# Altium footprint library User.PcbLib: 317 footprints (part 11 of 20)
Each footprint in its own frame and in the unit in brackets; x right, y up, seen from the top. Pads: shape width x height; smd on the part's side, far side on the other; paste and mask are expansions set on the pad; w line width, h text height; cw(c..) or ccw(c..) is an arc to the next point about the centre after c.
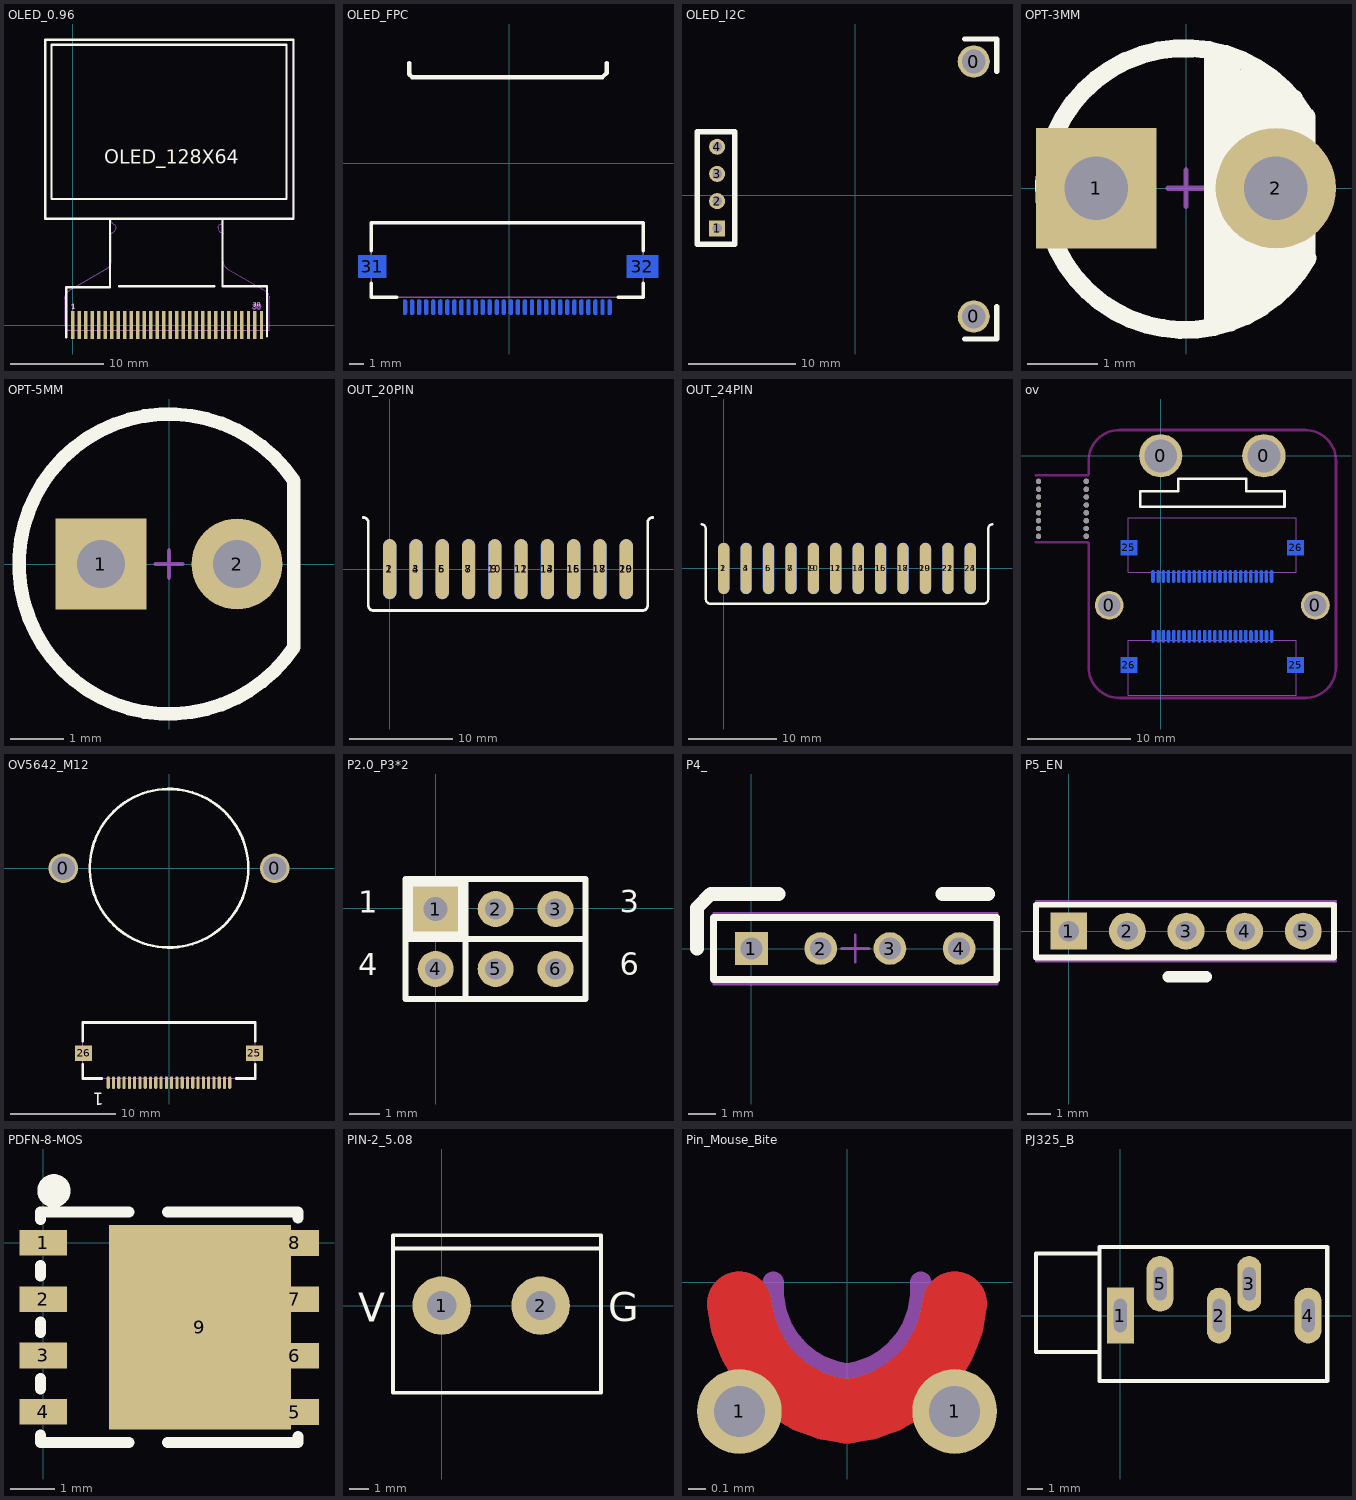
[diagram p10: the footprints below, top view; thin cyan lines are the x and y axes]

## OLED_0.96 [mil]
pads (30):
  rect 13.8x118.1 smd mask+2: 1(0,0) 2(27.6,-0.1) 3(55.1,-0.1) 4(82.7,-0.1) 5(110.2,-0.1) 6(137.8,-0.1) 7(165.3,-0.1) 8(192.9,-0.1) 9(220.5,-0.1) 10(248,-0.1) 11(275.6,-0.1) 12(303.1,-0.1) 13(330.7,-0.1) 14(358.3,-0.1) 15(385.8,-0.1) 16(413.4,-0.1) 17(440.9,-0.1) 18(468.5,-0.1) 19(496.1,-0.1) 20(523.6,-0.1) 21(551.2,-0.1) 22(578.7,-0.1) 23(606.3,-0.1) 24(633.9,-0.1) 25(661.4,-0.1) 26(689,-0.1) 27(716.5,-0.1) 28(744.1,-0.1) 29(771.6,-0.2) 30(799.2,-0.2)
Top Overlay:
  lines w10: -27.5,-51.3 -27.5,161.3 ; -27.2,159.7 157.8,159.7 157.8,451.1 ; 197.2,163.7 598.8,163.7 ; 634.2,447.1 634.2,163.7 823.2,163.7 ; 822.9,-47.4 822.9,165.2 ; -116.1,450.3 935.1,450.3 935.1,1208.6 -116.1,1208.6 -116.1,450.3 ; -90.2,533.8 905.8,533.8 905.8,1187.3 -90.2,1187.3 -90.2,533.8
  text "OLED_128X64" at 133.9,663.69 h100
  text "30" at 763,77.1 h20
  text "1" at -3.9,66.8 h20
Mechanical 6:
  region: 761.8,86.5 763.4,84.5 768.9,84.5 766.5,80.6 766.5,78.6 768.1,77.1 771.3,76.7 772,76.7 772.8,75.1 772.8,73.9 772,72.3 770.9,71.6 769.7,70.8 767.7,71.2 766.1,71.6 765.3,73.9 763.4,74.7 760.6,73.9 759.8,72.3 761,68.8 763.8,66.4 766.9,65.3 770.9,65.3 774.8,66.4 777.6,69.2 778.3,72.3 778.7,76.3 777.6,79.8 775.6,81.4 774.8,82.2 777.2,85.3 777.9,87.3 777.2,89.3 775.6,90.5 763.8,90.5 761.8,88.5
  region: 794.1,67.6 790.2,65.3 786.2,65.3 782.7,66.8 779.9,70 779.1,74.7 779.1,80.6 779.9,84.5 782.7,88.9 787.8,90.5 787.4,84.2 786.2,83.4 785.4,82.2 784.6,79 784.6,76.7 785.4,73.1 786.6,71.6 788.2,71.2 789.8,71.6 790.5,72.7 791.3,76.7 791.3,78.6 790.5,82.2 789.8,83.8 787.8,84.5 788.2,90.5 791.3,89.7 793.7,88.5 796.1,85.3 797.6,79.8 797.2,75.1 796.4,70.8 794.1,67.6
  region: -6.7,83.8 -5.1,81.8 -3.2,81.8 -1.6,82.2 -2,68.8 1.2,66 3.9,68.8 3.9,89.3 2,91.2 -0.8,90.8 -3.5,88.1 -6.3,86.5
Mechanical 15:
  drawing of 157 lines, arcs and shapes, not listed
3D body "oled-096.STEP": height 118.9, standoff 62.99, extent -116.1,-22.5 935.08,1208.6

## OLED_FPC [mm]
pads (32):
  oval 0.28x1.1 smd far side: 1(7.123,-10.209) 2(6.623,-10.209) 3(6.123,-10.209) 4(5.623,-10.209) 5(5.123,-10.209) 6(4.623,-10.209) 7(4.123,-10.209) 8(3.623,-10.209) 9(3.123,-10.209) 10(2.623,-10.209) 11(2.123,-10.209) 12(1.623,-10.209) 13(1.123,-10.209) 14(0.623,-10.209) 15(0.123,-10.209) 16(-0.377,-10.209) 17(-0.877,-10.209) 18(-1.377,-10.209) 19(-1.877,-10.209) 20(-2.377,-10.209) 21(-2.877,-10.209) 22(-3.377,-10.209) 23(-3.877,-10.209) 24(-4.377,-10.209) 25(-4.877,-10.209) 26(-5.377,-10.209) 27(-5.877,-10.209) 28(-6.377,-10.209) 29(-6.877,-10.209) 30(-7.377,-10.209)
  rect 2x1.6 smd far side: 31(-9.712,-7.329)
  rect 2.2x1.6 smd far side: 32(9.458,-7.329)
Top Overlay:
  lines w0.25: -9.777,-8.509 -9.777,-9.509 -7.977,-9.509 ; -9.777,-6.209 -9.777,-4.209 9.523,-4.209 9.523,-6.209 ; 7.723,-9.509 9.523,-9.509 9.523,-8.509
  lines w0.305: -7.079,7.102 -7.079,6.304 -6.877,6.102 -0.079,6.102 6.623,6.102 6.921,6.399 6.921,7.102
Mechanical 15:
  lines w0.1: -9.777,-9.509 -9.777,-4.209 9.523,-4.209 9.523,-9.509 -9.777,-9.509
3D body: height 4, standoff 3.5, extent -13.208,-12.624 12.954,6.376
3D body "HEADER-FPC-ZIF-SMD-Horizontal-0.5-30.stp": height 0.05, standoff -2.2, extent -9.677,-10.368 9.423,-3.869

## OLED_I2C [mm]
pads (6):
  round 3 hole 2.2: 0(11.072,-11.307) 0(11.072,12.493)
  rect 1.5x1.5 hole 0.9: 1(-12.881,-3.084)
  round 1.5 hole 0.9: 2(-12.881,-0.544) 3(-12.881,1.996) 4(-12.881,4.536)
Top Overlay:
  lines w0.5: 10.222,-13.407 13.222,-13.407 13.222,-10.407 ; 10.222,14.593 13.222,14.593 13.222,11.593 ; -14.731,-4.548 -14.731,5.952 -11.231,5.952 -11.231,-4.548 -14.731,-4.548
3D body "User Library-128x64I2COLEDDisplayAdafruit.step": height 13.47, standoff 2.63, extent -15.04,-12.624 12.82,14.076
3D body "Header-F-2.54X4.stp": height 8.6, standoff -3.1, extent -14.131,-4.479 -11.631,5.931

## OPT-3MM [mm] "3mm红外接收管"
height 6.35
pads (2):
  rect 1.7x1.7 hole 0.9: 1(-1.27,0)
  round 1.7 hole 0.9: 2(1.27,0)
Top Overlay:
  lines w0.254: 0.381,-1.905 0.381,1.905 ; 0.635,-1.778 0.635,1.778 ; 1.016,-1.651 1.016,1.524 ; 1.524,1.27 1.524,-1.27 1.27,-1.524 1.27,1.397 1.143,1.524 1.016,1.524 ; 1.685,1.025 ccw(c-0.016,-0.012) 1.72,-0.987 ; 1.702,-0.965 1.702,1.016 ; 0.889,1.651 0.889,-1.778 0.889,1.651 ; 0.889,1.651 1.016,1.524
Mechanical 15:
  lines w0.076: -0.254,0 0.254,0 ; 0,-0.254 0,0.254
3D body "LED 3mm-W.STEP": height 2.56, standoff -3.45, extent -1.623,-0.838 1.618,0.838
3D body "LED 3mm-玻璃罩.STEP": height 5.55, standoff 0.05, extent -1.95,-1.95 1.638,1.95

## OPT-5MM [mm] "5mm红外接收管"
height 10.16
pads (2):
  rect 1.7x1.7 hole 0.9: 1(-1.27,0)
  round 1.7 hole 0.9: 2(1.27,0)
Top Overlay:
  lines w0.254: 2.33,-1.553 cw(c0,0) 2.33,1.553 2.33,-1.553
Mechanical 15:
  lines w0.076: -0.254,0 0.254,0 ; 0,-0.254 0,0.254
3D body "LED 5mm玻璃罩.STEP": height 8.75, standoff 0.05, extent -2.85,-2.85 2.454,2.85
3D body "LED 5mm-W.STEP": height 4.5, standoff -3.45, extent -1.983,-0.795 2.076,0.805

## OUT_20PIN [mm]
pads (20):
  oval 1.27x5.8 smd: 1(0,0) 3(2.54,0) 5(5.08,0) 7(7.62,0) 9(10.16,0) 11(12.7,0) 13(15.24,0) 15(17.78,0) 17(20.32,0) 19(22.86,0)
  oval 1.27x5.8 smd far side: 2(0,0) 4(2.54,0) 6(5.08,0) 8(7.62,0) 10(10.16,0) 12(12.7,0) 14(15.24,0) 16(17.78,0) 18(20.32,0) 20(22.86,0)
Top Overlay:
  lines w0.254: -2.57,5 cw(c-2.57,4.5) -2.07,4.5 -2.07,-3.5 ccw(c-1.57,-3.5) -1.57,-4 24.43,-4 ccw(c24.43,-3.5) 24.93,-3.5 24.93,4.5 cw(c25.43,4.5) 25.43,5
Keep-Out Layer:
  lines w0.127: -2.57,5 cw(c-2.57,4.5) -2.07,4.5 -2.07,-3.5 ccw(c-1.57,-3.5) -1.57,-4 24.43,-4 ccw(c24.43,-3.5) 24.93,-3.5 24.93,4.5 cw(c25.43,4.5) 25.43,5

## OUT_24PIN [mm] "JIN-2.54MM"
pads (24):
  oval 1.27x5.8 smd: 1(-0.011,-0.008) 3(2.529,-0.008) 5(5.069,-0.008) 7(7.609,-0.008) 9(10.149,-0.008) 11(12.689,-0.008) 13(15.229,-0.008) 15(17.769,-0.008) 17(20.309,-0.008) 19(22.849,-0.008) 21(25.389,-0.008) 23(27.929,-0.008)
  oval 1.27x5.8 smd far side: 2(-0.011,-0.008) 4(2.529,-0.008) 6(5.069,-0.008) 8(7.609,-0.008) 10(10.149,-0.008) 12(12.689,-0.008) 14(15.229,-0.008) 16(17.769,-0.008) 18(20.309,-0.008) 20(22.849,-0.008) 22(25.389,-0.008) 24(27.929,-0.008)
Top Overlay:
  lines w0.254: -2.541,4.992 cw(c-2.541,4.492) -2.041,4.492 -2.041,-3.508 ccw(c-1.541,-3.508) -1.541,-4.008 29.459,-4.008 ccw(c29.459,-3.508) 29.959,-3.508 29.959,4.492 cw(c30.459,4.492) 30.459,4.992
Keep-Out Layer:
  lines w0.127: -2.541,4.992 cw(c-2.541,4.492) -2.041,4.492 -2.041,-3.508 ccw(c-1.541,-3.508) -1.541,-4.008 29.459,-4.008 ccw(c29.459,-3.508) 29.959,-3.508 29.959,4.492 cw(c30.459,4.492) 30.459,4.992

## ov [mm]
pads (72):
  round 2.8 hole 2.2: 0(-5,-14.5) 0(15,-14.5)
  round 4.2 hole 3.2: 0(0,0) 0(10,0)
  oval 0.3x1.2 smd far side: 1(10.746,-11.712) 1(10.754,-17.52) 2(10.246,-11.712) 2(10.254,-17.52) 3(9.746,-11.712) 3(9.754,-17.52) 4(9.246,-11.712) 4(9.254,-17.52) 5(8.746,-11.712) 5(8.754,-17.52) 6(8.246,-11.712) 6(8.254,-17.52) 7(7.746,-11.712) 7(7.754,-17.52) 8(7.246,-11.712) 8(7.254,-17.52) 9(6.746,-11.712) 9(6.754,-17.52) 10(6.246,-11.712) 10(6.254,-17.52) 11(5.746,-11.712) 11(5.754,-17.52) 12(5.246,-11.712) 12(5.254,-17.52) 13(4.746,-11.712) 13(4.754,-17.52) 14(4.246,-11.712) 14(4.254,-17.52) 15(3.746,-11.712) 15(3.754,-17.52) 16(3.246,-11.712) 16(3.254,-17.52) 17(2.746,-11.712) 17(2.754,-17.52) 18(2.246,-11.712) 18(2.254,-17.52) 19(1.746,-11.712) 19(1.754,-17.52) 20(1.246,-11.712) 20(1.254,-17.52) 21(0.746,-11.712) 21(0.754,-17.52) 22(0.246,-11.712) 22(0.254,-17.52) 23(-0.254,-11.712) 23(-0.246,-17.52) 24(-0.754,-11.712) 24(-0.746,-17.52)
  rect 1.6x1.5 smd far side: 25(-3.081,-8.923) 25(13.089,-20.308) 26(-3.081,-20.308) 26(13.089,-8.923)
  round 0.508 hole 0.508: k(-11.848,-7.817) k(-11.848,-7.055) k(-11.848,-6.293) k(-11.848,-5.531) k(-11.848,-4.769) k(-11.848,-4.007) k(-11.848,-3.245) k(-11.848,-2.483) k(-7.229,-7.817) k(-7.229,-7.055) k(-7.229,-6.293) k(-7.229,-5.531) k(-7.229,-4.769) k(-7.229,-4.007) k(-7.229,-3.245) k(-7.229,-2.483)
Top Overlay:
  lines w0.254: -2,-4.948 12,-4.948 12,-3.448 8.3,-3.448 8.3,-2.248 1.7,-2.248 1.7,-3.448 -2,-3.448 -2,-4.948
Bottom Overlay:
  lines w0.25: -3.146,-21.425 -3.146,-23.218 13.154,-23.218 13.154,-21.425 ; -3.146,-19.266 -3.146,-17.918 -1.346,-17.918 ; -3.146,-9.966 -3.146,-11.314 -1.346,-11.314 ; -3.146,-7.807 -3.146,-6.014 13.154,-6.014 13.154,-7.807 ; 11.354,-17.918 13.154,-17.918 13.154,-19.266 ; 11.354,-11.314 13.154,-11.314 13.154,-9.966
  text "1" at 11.194,-12.226 h2.03
Keep-Out Layer:
  lines w0.254: -12.102,-8.401 -7.102,-8.401 -7,-8.503 -7,-20.5 ccw(c-4,-20.5) -4,-23.5 14,-23.5 ccw(c14,-20.5) 17,-20.5 17,-0.5 ccw(c14,-0.5) 14,2.5 -4,2.5 ccw(c-4,-0.5) -7,-0.5 -7,-1.797 -7.102,-1.899 -12.102,-1.899
Mechanical 15:
  lines w0.1: -3.146,-23.218 -3.146,-17.918 13.154,-17.918 13.154,-23.218 -3.146,-23.218 ; -3.146,-11.314 -3.146,-6.014 13.154,-6.014 13.154,-11.314 -3.146,-11.314
3D body "HEADER-FPC-ZIF-SMD-Horizontal-0.5-24.stp": height 2.2, standoff -0.05, extent -3.046,-23.811 13.054,-17.312
3D body "User Library-OV2640.sldprt": height 14.4, standoff 1.2, extent -1.147,-22.47 11.353,3.03
3D body "HEADER-FPC-ZIF-SMD-Horizontal-0.5-24.stp": height 2.2, standoff -0.05, extent -3.046,-11.92 13.054,-5.42
3D body: height 4, standoff 1.2, extent -3.5,-23 13.5,-6

## OV5642_M12 [mm] "8.5MM"
pads (28):
  round 2.8 hole 2.2: 0(-10,0) 0(10,0)
  oval 0.3x1.2 smd: 1(-5.75,-20.288) 2(-5.25,-20.288) 3(-4.75,-20.288) 4(-4.25,-20.288) 5(-3.75,-20.288) 6(-3.25,-20.288) 7(-2.75,-20.288) 8(-2.25,-20.288) 9(-1.75,-20.288) 10(-1.25,-20.288) 11(-0.75,-20.288) 12(-0.25,-20.288) 13(0.25,-20.288) 14(0.75,-20.288) 15(1.25,-20.288) 16(1.75,-20.288) 17(2.25,-20.288) 18(2.75,-20.288) 19(3.25,-20.288) 20(3.75,-20.288) 21(4.25,-20.288) 22(4.75,-20.288) 23(5.25,-20.288) 24(5.75,-20.288)
  rect 1.6x1.5 smd: 25(8.085,-17.5) 26(-8.085,-17.5)
Top Overlay:
  circle w0.254: c0,0 r7.5
  lines w0.25: -8.15,-18.542 -8.15,-19.89 -6.35,-19.89 ; -8.15,-16.383 -8.15,-14.59 8.15,-14.59 8.15,-16.383 ; 6.35,-19.89 8.15,-19.89 8.15,-18.542
  text "1" at -6.198,-20.803 h2.03
Mechanical 15:
  lines w0.1: -8.15,-19.89 8.15,-19.89 8.15,-14.59 -8.15,-14.59 -8.15,-19.89
3D body "User Library-OV2640.sldprt": height 14.4, standoff 1.2, extent -6.353,-17.53 6.147,7.97
3D body: height 4, standoff 1.2, extent -8.5,-8.5 8.5,8.5
3D body "HEADER-FPC-ZIF-SMD-Horizontal-0.5-24.stp": height 2.2, standoff -0.05, extent -8.05,-20.496 8.05,-13.997

## P2.0_P3*2 [mm]
pads (6):
  rect 1.5x1.5 hole 0.8: 1(0,-0.025)
  round 1.2 hole 0.7: 2(2,-0.025) 3(4,-0.025) 4(0,-2.025) 5(2,-2.025) 6(4,-2.025)
Top Overlay:
  rectangle: -1,-1.025 1,0.975
  lines w0.2: 1,-3.025 1,-1.025 1,0.975 ; -1,-1.025 5,-1.025 ; -1,-1.025 -1,0.975 5,0.975 5,-1.025 ; -1,-1.025 5,-1.025 ; -1,-1.025 -1,-3.025 5,-3.025 5,-1.025
  text "6" at 6.147,-2.473 h1.27
  text "3" at 6.147,-0.39 h1.27
  text "4" at -2.591,-2.493 h1.27
  text "1" at -2.591,-0.401 h1.27
3D body "HDR2.0-LI-2x3P.STEP": height 6.5, standoff -2.8, extent -1,-3.025 5,0.975

## P4_ [mm]
pads (4):
  rect 1.2x1.2 hole 0.8: 1(0,0)
  round 1.2 hole 0.8: 2(2.54,0) 3(5.08,0) 4(7.62,0)
Top Overlay:
  lines w0.254: -1.39,-1.143 -1.39,1.143 9,1.143 9,-1.143 -1.39,-1.143
  lines w0.5: -2,0 -2,1.5 -1.5,2 1,2 ; 7,2 8.69,2
Mechanical 15:
  lines w0.1: 3.31,0 4.31,0 ; 3.81,-0.5 3.81,0.5 ; -1.39,-1.3 -1.39,1.3 9.01,1.3 9.01,-1.3 -1.39,-1.3
3D body "HEADER 4H.STEP": height 4.43, standoff -2.9, extent -1.27,-7 8.89,1.27

## P5_EN [mm]
pads (5):
  rect 1.6x1.6 hole 0.9: 1(0,0)
  round 1.6 hole 0.9: 2(2.54,0) 3(5.08,0) 4(7.62,0) 5(10.16,0)
Top Overlay:
  lines w0.254: -1.42,-1.143 -1.42,1.143 11.5,1.143 11.5,-1.143 -1.42,-1.143
  lines w0.5: 4.318,-1.981 5.96,-1.975
Mechanical 15:
  lines w0.1: -1.42,-1.3 -1.42,1.3 11.58,1.3 11.58,-1.3 -1.42,-1.3
3D body "Header-F-2.54X5.stp": height 8.6, standoff -3.1, extent -1.395,-1.25 11.555,1.25

## PDFN-8-MOS [mm]
pads (9):
  rect 1.079x0.58 smd: 1(0,0) 2(0,-1.27) 3(0,-2.54) 4(0,-3.81)
  rect 1.08x0.58 smd: 5(5.669,-3.815) 6(5.669,-2.545) 7(5.669,-1.275) 8(5.669,-0.005)
  rect 4.1x4.6 smd: 9(3.53,-1.905)
Top Overlay:
  lines w0.25: -0.06,-4.334 -0.06,-4.505 1.937,-4.505 ; -0.06,-3.296 -0.06,-3.064 ; -0.06,-2.026 -0.06,-1.784 ; -0.06,-0.746 -0.06,-0.514 ; -0.06,0.524 -0.06,0.695 1.937,0.695 ; 2.802,-4.505 5.74,-4.505 5.74,-4.368 5.74,-4.405 ; 2.802,0.695 5.74,0.695 5.74,0.558 5.74,0.595
  lines w0.5: 0.24,1.295 ccw(c0.241,1.17) 0.242,1.295
Top Paste:
  region: 0.545,-3.515 0.545,-4.105 -0.545,-4.105 -0.545,-3.515
  region: 0.545,-2.245 0.545,-2.835 -0.545,-2.835 -0.545,-2.245
  region: 0.545,-0.975 0.545,-1.565 -0.545,-1.565 -0.545,-0.975
  region: 0.545,0.295 0.545,-0.295 -0.545,-0.295 -0.545,0.295
  region: 5.165,0.395 5.165,-4.205 1.475,-4.205 1.475,0.395
  region: 6.215,-3.515 6.215,-4.095 5.585,-4.095 5.585,-3.515
  region: 6.215,-2.255 6.215,-2.835 5.585,-2.835 5.585,-2.255
  region: 6.215,-0.985 6.215,-1.565 5.585,-1.565 5.585,-0.985
  region: 6.215,0.285 6.215,-0.295 5.585,-0.295 5.585,0.285

## PIN-2_5.08 [mm]
pads (2):
  round 3 hole 1.5: 1(0,0) 2(5.08,0)
Top Overlay:
  lines w0.2: -2.438,2.921 8.119,2.921 ; -2.489,-4.47 -2.489,3.607 8.179,3.607 8.179,-4.47 -2.489,-4.47
  text "G" at 8.56,-1.289 h2.54
  text "V" at -4.293,-1.329 h2.54
3D body "3A-2way.step": height 10, standoff -3, extent -2.481,-4.577 8.119,3.023

## Pin_Mouse_Bite [mm] "2.54mm"
pads (2):
  round 0.5 hole 0.3: 1(-0.635,-0.762) 1(0.635,-0.762)
Top Layer:
  lines w0.381: -0.635,-0.127 ccw(c0.064,-0.064) 0,-0.762 ccw(c-0.064,-0.064) 0.635,-0.127
Bottom Layer:
  lines w0.381: -0.635,-0.127 ccw(c0.064,-0.064) 0,-0.762 ccw(c-0.064,-0.064) 0.635,-0.127
Top Solder:
  lines w0.381: -0.635,-0.127 ccw(c0.064,-0.064) 0,-0.762 ccw(c-0.064,-0.064) 0.635,-0.127
Bottom Solder:
  lines w0.381: -0.635,-0.127 ccw(c0.064,-0.064) 0,-0.762 ccw(c-0.064,-0.064) 0.635,-0.127
Mechanical 1:
  lines w0.127: -0.434,0 ccw(c0.064,-0.045) 0.018,-0.543 ; -0.018,-0.543 ccw(c-0.064,-0.045) 0.434,0

## PJ325_B [mm] "蓝色，18*8.1*12.3mm"
pads (5):
  rect 1.7x3.5 hole 0.8 slot 2.1 at 90 deg: 1(0,0)
  oval 1.5x3.5 hole 0.8 slot 2.1 at 90 deg: 2(6.2,0) 3(8.1,2)
  oval 1.7x3.5 hole 0.8 slot 2.1 at 90 deg: 4(11.8,0) 5(2.5,2)
Top Overlay:
  lines w0.254: -1.3,-2.3 -5.3,-2.3 -5.3,3.9 -1.3,3.9 ; -1.3,-4.1 -1.3,4.3 13,4.3 13,-4.1 -1.3,-4.1
3D body "PJ325_B.STEP": height 12.35, standoff -2.9, extent -5.23,-3.9 12.8,4.2